# Altium footprint library Generic Footprint.PcbLib: 160 footprints (part 15 of 20) (continued)
## Symbol_FCC-Logo-3x2mm_Silkscreen [mm] (continued)
1(0.036,1.073) 1(0.036,1.076) 1(0.036,1.079) 1(0.036,1.083) 1(0.036,1.086) 1(0.036,1.09) 1(0.036,1.093) 1(0.036,1.096) 1(0.036,1.1) 1(0.036,1.103) 1(0.036,1.107) 1(0.036,1.11) 1(0.036,1.113) 1(0.036,1.117) 1(0.036,1.12) 1(0.036,1.124) 1(0.036,1.127) 1(0.036,1.13) 1(0.036,1.134) 1(0.036,1.137) 1(0.036,1.141) 1(0.036,1.144) 1(0.036,1.147) 1(0.036,1.151) 1(0.036,1.154) 1(0.036,1.158) 1(0.036,1.161) 1(0.036,1.164) 1(0.036,1.168) 1(0.036,1.171) 1(0.036,1.175) 1(0.036,1.178) 1(0.036,1.181) 1(0.036,1.185) 1(0.036,1.188) 1(0.036,1.192) 1(0.036,1.195) 1(0.036,1.198) 1(0.036,1.202) 1(0.036,1.205) 1(0.036,1.209) 1(0.036,1.212) 1(0.036,1.215) 1(0.036,1.219) 1(0.036,1.222) 1(0.036,1.226) 1(0.036,1.229) 1(0.036,1.232) 1(0.036,1.236) 1(0.036,1.239) 1(0.036,1.243) 1(0.036,1.246) 1(0.036,1.249) 1(0.036,1.253) 1(0.036,1.256) 1(0.036,1.26) 1(0.036,1.263) 1(0.036,1.266) 1(0.036,1.27) 1(0.036,1.273) 1(0.036,1.277) 1(0.036,1.28) 1(0.036,1.283) 1(0.036,1.287) 1(0.036,1.29) 1(0.036,1.294) 1(0.036,1.297) 1(0.036,1.3) 1(0.036,1.304) 1(0.036,1.307) 1(0.036,1.311) 1(0.036,1.314) 1(0.036,1.317) 1(0.036,1.321) 1(0.036,1.324) 1(0.036,1.328) 1(0.036,1.331) 1(0.036,1.334) 1(0.036,1.338) 1(0.036,1.341) 1(0.036,1.345) 1(0.036,1.348) 1(0.036,1.351) 1(0.036,1.355) 1(0.036,1.358) 1(0.036,1.362) 1(0.036,1.365) 1(0.036,1.368) 1(0.036,1.372) 1(0.036,1.375) 1(0.036,1.379) 1(0.036,1.382) 1(0.036,1.385) 1(0.036,1.389) 1(0.036,1.392) 1(0.036,1.396) 1(0.036,1.399) 1(0.036,1.402) 1(0.036,1.406) 1(0.036,1.409) 1(0.036,1.413) 1(0.036,1.416) 1(0.036,1.419) 1(0.036,1.423) 1(0.036,1.426) 1(0.036,1.43) 1(0.036,1.433) 1(0.036,1.436) 1(0.036,1.44) 1(0.036,1.443) 1(0.036,1.447) 1(0.036,1.45) 1(0.036,1.453) 1(0.036,1.457) 1(0.036,1.46) 1(0.036,1.464) 1(0.036,1.467) 1(0.036,1.47) 1(0.036,1.474) 1(0.036,1.477) 1(0.036,1.481) 1(0.036,1.484) 1(0.036,1.487) 1(0.036,1.491) 1(0.036,1.494) 1(0.036,1.498) 1(0.036,1.501) 1(0.036,1.504) 1(0.036,1.508) 1(0.036,1.511) 1(0.036,1.515) 1(0.036,1.518) 1(0.036,1.521) 1(0.036,1.525) 1(0.036,1.528) 1(0.036,1.532) 1(0.036,1.535) 1(0.036,1.538) 1(0.036,1.542) 1(0.036,1.545) 1(0.036,1.549) 1(0.036,1.552) 1(0.036,1.555) 1(0.036,1.559) 1(0.036,1.562) 1(0.036,1.566) 1(0.036,1.569) 1(0.036,1.572) 1(0.036,1.576) 1(0.036,1.579) 1(0.036,1.583) 1(0.036,1.586) 1(0.036,1.589) 1(0.036,1.593) 1(0.036,1.596) 1(0.036,1.6) 1(0.036,1.603) 1(0.036,1.606) 1(0.036,1.61) 1(0.036,1.613) 1(0.036,1.617) 1(0.036,1.62) 1(0.036,1.623) 1(0.036,1.627) 1(0.036,1.63) 1(0.036,1.634) 1(0.036,1.637) 1(0.036,1.64) 1(0.036,1.644) 1(0.036,1.647) 1(0.036,1.651) 1(0.036,1.654) 1(0.036,1.657) 1(0.036,1.661) 1(0.036,1.664) 1(0.036,1.668) 1(0.036,1.671) 1(0.036,1.674) 1(0.036,1.678) 1(0.036,1.681) 1(0.036,1.685) 1(0.036,1.688) 1(0.036,1.691) 1(0.036,1.695) 1(0.036,1.698) 1(0.036,1.702) 1(0.036,1.705) 1(0.036,1.708) 1(0.036,1.712) 1(0.036,1.715) 1(0.036,1.719) 1(0.036,1.722) 1(0.036,1.725) 1(0.036,1.729) 1(0.036,1.732) 1(0.036,1.736) 1(0.036,1.739) 1(0.036,1.742) 1(0.036,1.746) 1(0.036,1.749) 1(0.036,1.753) 1(0.036,1.756) 1(0.036,1.759) 1(0.036,1.763) 1(0.036,1.766) 1(0.036,1.77) 1(0.036,1.773) 1(0.036,1.776) 1(0.036,1.78) 1(0.036,1.783) 1(0.036,1.787) 1(0.036,1.79) 1(0.036,1.793) 1(0.036,1.797) 1(0.036,1.8) 1(0.036,1.804) 1(0.036,1.807) 1(0.036,1.81) 1(0.036,1.814) 1(0.036,1.817) 1(0.036,1.821) 1(0.036,1.824) 1(0.036,1.827) 1(0.036,1.831) 1(0.036,1.838) 1(0.036,1.841) 1(0.036,1.844) 1(0.036,1.848) 1(0.036,1.851) 1(0.036,1.855) 1(0.036,1.858) 1(0.036,1.861) 1(0.039,0.046) 1(0.039,0.049) 1(0.039,0.053) 1(0.039,0.059) 1(0.039,1.841) 1(0.039,1.844) 1(0.039,1.848) 1(0.039,1.851) 1(0.039,1.855) 1(0.039,1.858) 1(0.039,1.861) 1(0.039,1.868) 1(0.039,1.872) 1(0.039,1.875) 1(0.042,0.049) 1(0.042,0.053) 1(0.042,0.056) 1(0.042,1.855) 1(0.042,1.858) 1(0.042,1.861) 1(0.042,1.865) 1(0.042,1.868) 1(0.042,1.872) 1(0.042,1.875) 1(0.042,1.882) 1(0.042,1.892) 1(0.046,0.042) 1(0.046,0.046) 1(0.046,1.868) 1(0.046,1.872) 1(0.046,1.875) 1(0.046,1.878) 1(0.046,1.882) 1(0.046,1.889) 1(0.049,0.039) 1(0.049,0.042) 1(0.049,0.046) 1(0.049,1.892) 1(0.049,1.899) 1(0.049,1.902) 1(0.049,1.906) 1(0.053,1.882) 1(0.053,1.885) 1(0.053,1.909) 1(0.056,0.036) 1(0.056,1.892) 1(0.056,1.895) 1(0.056,1.912) 1(0.056,1.916) 1(0.056,1.919) 1(0.056,1.923) 1(0.059,0.039) 1(0.059,0.042) 1(0.059,1.916) 1(0.059,1.919) 1(0.059,1.923) 1(0.059,1.929) 1(0.063,0.032) 1(0.063,1.916) 1(0.063,1.919) 1(0.063,1.923) 1(0.063,1.929) 1(0.066,0.036) 1(0.066,0.039) 1(0.07,1.926) 1(0.07,1.929) 1(0.07,1.943) 1(0.073,0.029) 1(0.073,1.933) 1(0.073,1.936) 1(0.073,1.94) 1(0.073,1.943) 1(0.073,1.95) 1(0.073,1.953) 1(0.073,1.957) 1(0.073,1.96) 1(0.076,0.025) 1(0.076,0.032) 1(0.076,0.036) 1(0.076,1.943) 1(0.076,1.946) 1(0.076,1.95) 1(0.076,1.953) 1(0.076,1.963) 1(0.08,1.95) 1(0.08,1.953) 1(0.08,1.96) 1(0.08,1.963) 1(0.08,1.967) 1(0.083,1.96) 1(0.083,1.963) 1(0.083,1.97) 1(0.087,1.974) 1(0.087,1.977) 1(0.09,1.977) 1(0.09,1.98) 1(0.093,1.977) 1(0.093,1.98) 1(0.093,1.987) 1(0.093,1.991) 1(0.097,1.98) 1(0.097,1.987) 1(0.097,1.991) 1(0.097,1.997) 1(0.1,1.984) 1(0.1,1.994) 1(0.1,2.001) 1(0.104,1.987) 1(0.104,1.991) 1(0.104,1.994) 1(0.104,1.997) 1(0.107,1.994) 1(0.107,1.997) 1(0.107,2.004) 1(0.107,2.008) 1(0.107,2.011) 1(0.11,2.014) 1(0.114,2.018) 1(0.121,2.025) 1(0.121,2.028) 1(0.124,2.025) 1(0.124,2.028) 1(0.124,2.031) 1(0.127,2.021) 1(0.127,2.025) 1(0.127,2.031) 1(0.127,2.035) 1(0.131,2.028) 1(0.131,2.035) 1(0.131,2.038) 1(0.134,2.031) 1(0.134,2.035) 1(0.134,2.042) 1(0.138,2.038) 1(0.138,2.045) 1(0.141,2.038) 1(0.141,2.048) 1(0.144,2.052) 1(0.148,2.048) 1(0.148,2.055) 1(0.151,2.048) 1(0.151,2.052) 1(0.151,2.059) 1(0.155,2.052) 1(0.155,2.055) 1(0.155,2.062) 1(0.158,2.055) 1(0.158,2.059) 1(0.158,2.062) 1(0.158,2.065) 1(0.161,2.059) 1(0.161,2.065) 1(0.161,2.069) 1(0.165,2.062) 1(0.165,2.072) 1(0.168,2.065) 1(0.172,2.076) 1(0.175,2.079) 1(0.178,2.082) 1(0.182,2.079) 1(0.185,2.086) 1(0.189,2.079) 1(0.189,2.089) 1(0.192,2.093) 1(0.195,2.089) 1(0.195,2.093) 1(0.195,2.096) 1(0.202,2.089) 1(0.202,2.096) 1(0.202,2.099) 1(0.206,2.093) 1(0.212,2.096) 1(0.212,2.103) 1(0.216,2.106) 1(0.219,2.11) 1(0.229,2.106) 1(0.229,2.11) 1(0.229,2.113) 1(0.236,2.106) 1(0.236,2.11) 1(0.24,2.113) 1(0.24,2.116) 1(0.246,2.113) 1(0.246,2.116) 1(0.246,2.12) 1(0.26,2.116) 1(0.26,2.12) 1(0.26,2.123) 1(0.27,2.127) 1(0.274,2.12) 1(0.274,2.13) 1(0.277,2.123) 1(0.294,2.123) 1(0.297,2.133) 1(0.365,0.029) 1(0.365,0.042) 1(0.365,0.046) 1(0.365,0.049) 1(0.365,0.053) 1(0.365,0.056) 1(0.365,0.059) 1(0.365,0.063) 1(0.365,0.066) 1(0.365,0.07) 1(0.365,0.073) 1(0.365,0.076) 1(0.365,0.08) 1(0.365,0.083) 1(0.365,0.087) 1(0.365,0.09) 1(0.365,0.093) 1(0.365,0.097) 1(0.365,0.1) 1(0.365,0.104) 1(0.365,0.107) 1(0.365,0.11) 1(0.365,0.114) 1(0.365,0.117) 1(0.365,0.121) 1(0.365,0.124) 1(0.365,0.127) 1(0.365,0.131) 1(0.365,0.134) 1(0.365,0.138) 1(0.365,0.141) 1(0.365,0.144) 1(0.365,0.148) 1(0.365,0.151) 1(0.365,0.155) 1(0.365,0.158) 1(0.365,0.161) 1(0.365,0.165) 1(0.365,0.168) 1(0.365,0.172) 1(0.365,0.175) 1(0.365,0.178) 1(0.365,0.182) 1(0.365,0.185) 1(0.365,0.189) 1(0.365,0.192) 1(0.365,0.195) 1(0.365,0.199) 1(0.365,0.202) 1(0.365,0.206) 1(0.365,0.209) 1(0.365,0.212) 1(0.365,0.216) 1(0.365,0.219) 1(0.365,0.223) 1(0.365,0.226) 1(0.365,0.229) 1(0.365,0.233) 1(0.365,0.236) 1(0.365,0.24) 1(0.365,0.243) 1(0.365,0.246) 1(0.365,0.25) 1(0.365,0.253) 1(0.365,0.257) 1(0.365,0.26) 1(0.365,0.263) 1(0.365,0.267) 1(0.365,0.27) 1(0.365,0.274) 1(0.365,0.277) 1(0.365,0.28) 1(0.365,0.284) 1(0.365,0.287) 1(0.365,0.291) 1(0.365,0.294) 1(0.365,0.297) 1(0.365,0.301) 1(0.365,0.304) 1(0.365,0.308) 1(0.365,0.311) 1(0.365,0.314) 1(0.365,0.318) 1(0.365,0.321) 1(0.365,0.325) 1(0.365,0.328) 1(0.365,0.331) 1(0.365,0.335) 1(0.365,0.338) 1(0.365,0.342) 1(0.365,0.345) 1(0.365,0.348) 1(0.365,0.352) 1(0.365,0.355) 1(0.365,0.359) 1(0.365,0.362) 1(0.365,0.365) 1(0.365,0.369) 1(0.365,0.372) 1(0.365,0.376) 1(0.365,0.379) 1(0.365,0.382) 1(0.365,0.386) 1(0.365,0.389) 1(0.365,0.393) 1(0.365,0.396) 1(0.365,0.399) 1(0.365,0.403) 1(0.365,0.406) 1(0.365,0.41) 1(0.365,0.413) 1(0.365,0.416) 1(0.365,0.42) 1(0.365,0.423) 1(0.365,0.427) 1(0.365,0.43) 1(0.365,0.433) 1(0.365,0.437) 1(0.365,0.44) 1(0.365,0.444) 1(0.365,0.447) 1(0.365,0.45) 1(0.365,0.454) 1(0.365,0.457) 1(0.365,0.461) 1(0.365,0.464) 1(0.365,0.467) 1(0.365,0.471) 1(0.365,0.474) 1(0.365,0.478) 1(0.365,0.481) 1(0.365,0.484) 1(0.365,0.488) 1(0.365,0.491) 1(0.365,0.495) 1(0.365,0.498) 1(0.365,0.501) 1(0.365,0.505) 1(0.365,0.508) 1(0.365,0.512) 1(0.365,0.515) 1(0.365,0.518) 1(0.365,0.522) 1(0.365,0.525) 1(0.365,0.529) 1(0.365,0.532) 1(0.365,0.535) 1(0.365,0.539) 1(0.365,0.542) 1(0.365,0.546) 1(0.365,0.549) 1(0.365,0.552) 1(0.365,0.556) 1(0.365,0.559) 1(0.365,0.563) 1(0.365,0.566) 1(0.365,0.569) 1(0.365,0.573) 1(0.365,0.576) 1(0.365,0.58) 1(0.365,0.583) 1(0.365,0.586) 1(0.365,0.59) 1(0.365,0.593) 1(0.365,0.597) 1(0.365,0.6) 1(0.365,0.603) 1(0.365,0.607) 1(0.365,0.61) 1(0.365,0.614) 1(0.365,0.617) 1(0.365,0.62) 1(0.365,0.624) 1(0.365,0.627) 1(0.365,0.631) 1(0.365,0.634) 1(0.365,0.637) 1(0.365,0.641) 1(0.365,0.644) 1(0.365,0.648) 1(0.365,0.651) 1(0.365,0.654) 1(0.365,0.658) 1(0.365,0.661) 1(0.365,0.665) 1(0.365,0.668) 1(0.365,0.671) 1(0.365,0.675) 1(0.365,0.678) 1(0.365,0.682) 1(0.365,0.685) 1(0.365,0.688) 1(0.365,0.692) 1(0.365,0.695) 1(0.365,0.699) 1(0.365,0.702) 1(0.365,0.705) 1(0.365,0.709) 1(0.365,0.712) 1(0.365,0.716) 1(0.365,0.719) 1(0.365,0.722) 1(0.365,0.726) 1(0.365,0.729) 1(0.365,0.733) 1(0.365,0.736) 1(0.365,0.739) 1(0.365,0.743) 1(0.365,0.746) 1(0.365,0.75) 1(0.365,0.753) 1(0.365,0.756) 1(0.365,0.76) 1(0.365,0.763) 1(0.365,0.767) 1(0.365,0.77) 1(0.365,0.773) 1(0.365,0.777) 1(0.365,0.78) 1(0.365,0.784) 1(0.365,0.787) 1(0.365,0.79) 1(0.365,0.794) 1(0.365,0.797) 1(0.365,0.801) 1(0.365,0.804) 1(0.365,0.807) 1(0.365,0.811) 1(0.365,0.814) 1(0.365,0.818) 1(0.365,0.821) 1(0.365,0.824) 1(0.365,0.828) 1(0.365,0.831) 1(0.365,0.835) 1(0.365,0.838) 1(0.365,0.841) 1(0.365,0.845) 1(0.365,0.848) 1(0.365,0.852) 1(0.365,0.855) 1(0.365,0.858) 1(0.365,0.862) 1(0.365,0.865) 1(0.365,0.869) 1(0.365,0.872) 1(0.365,0.875) 1(0.365,0.879) 1(0.365,0.882) 1(0.365,0.886) 1(0.365,0.889) 1(0.365,0.892) 1(0.365,0.896) 1(0.365,0.903) 1(0.365,1.722) 1(0.365,1.725) 1(0.369,0.025) 1(0.369,0.042) 1(0.369,0.046) 1(0.369,0.049) 1(0.369,0.053) 1(0.369,0.056) 1(0.369,0.059) 1(0.369,0.063) 1(0.369,0.066) 1(0.369,0.07) 1(0.369,0.073) 1(0.369,0.076) 1(0.369,0.08) 1(0.369,0.083) 1(0.369,0.087) 1(0.369,0.09) 1(0.369,0.093) 1(0.369,0.097) 1(0.369,0.1) 1(0.369,0.104) 1(0.369,0.107) 1(0.369,0.11) 1(0.369,0.114) 1(0.369,0.117) 1(0.369,0.121) 1(0.369,0.124) 1(0.369,0.127) 1(0.369,0.131) 1(0.369,0.134) 1(0.369,0.138) 1(0.369,0.141) 1(0.369,0.144) 1(0.369,0.148) 1(0.369,0.151) 1(0.369,0.155) 1(0.369,0.158) 1(0.369,0.161) 1(0.369,0.165) 1(0.369,0.168) 1(0.369,0.172) 1(0.369,0.175) 1(0.369,0.178) 1(0.369,0.182) 1(0.369,0.185) 1(0.369,0.189) 1(0.369,0.192) 1(0.369,0.195) 1(0.369,0.199) 1(0.369,0.202) 1(0.369,0.206) 1(0.369,0.209) 1(0.369,0.212) 1(0.369,0.216) 1(0.369,0.219) 1(0.369,0.223) 1(0.369,0.226) 1(0.369,0.229) 1(0.369,0.233) 1(0.369,0.236) 1(0.369,0.24) 1(0.369,0.243) 1(0.369,0.246) 1(0.369,0.25) 1(0.369,0.253) 1(0.369,0.257) 1(0.369,0.26) 1(0.369,0.263) 1(0.369,0.267) 1(0.369,0.27) 1(0.369,0.274) 1(0.369,0.277) 1(0.369,0.28) 1(0.369,0.284) 1(0.369,0.287) 1(0.369,0.291) 1(0.369,0.294) 1(0.369,0.297) 1(0.369,0.301) 1(0.369,0.304) 1(0.369,0.308) 1(0.369,0.311) 1(0.369,0.314) 1(0.369,0.318) 1(0.369,0.321) 1(0.369,0.325) 1(0.369,0.328) 1(0.369,0.331) 1(0.369,0.335) 1(0.369,0.338) 1(0.369,0.342) 1(0.369,0.345) 1(0.369,0.348) 1(0.369,0.352) 1(0.369,0.355) 1(0.369,0.359) 1(0.369,0.362) 1(0.369,0.365) 1(0.369,0.369) 1(0.369,0.372) 1(0.369,0.376) 1(0.369,0.379) 1(0.369,0.382) 1(0.369,0.386) 1(0.369,0.389) 1(0.369,0.393) 1(0.369,0.396) 1(0.369,0.399) 1(0.369,0.403) 1(0.369,0.406) 1(0.369,0.41) 1(0.369,0.413) 1(0.369,0.416) 1(0.369,0.42) 1(0.369,0.423) 1(0.369,0.427) 1(0.369,0.43) 1(0.369,0.433) 1(0.369,0.437) 1(0.369,0.44) 1(0.369,0.444) 1(0.369,0.447) 1(0.369,0.45) 1(0.369,0.454) 1(0.369,0.457) 1(0.369,0.461) 1(0.369,0.464) 1(0.369,0.467) 1(0.369,0.471) 1(0.369,0.474) 1(0.369,0.478) 1(0.369,0.481) 1(0.369,0.484) 1(0.369,0.488) 1(0.369,0.491) 1(0.369,0.495) 1(0.369,0.498) 1(0.369,0.501) 1(0.369,0.505) 1(0.369,0.508) 1(0.369,0.512) 1(0.369,0.515) 1(0.369,0.518) 1(0.369,0.522) 1(0.369,0.525) 1(0.369,0.529) 1(0.369,0.532) 1(0.369,0.535) 1(0.369,0.539) 1(0.369,0.542) 1(0.369,0.546) 1(0.369,0.549) 1(0.369,0.552) 1(0.369,0.556) 1(0.369,0.559) 1(0.369,0.563) 1(0.369,0.566) 1(0.369,0.569) 1(0.369,0.573) 1(0.369,0.576) 1(0.369,0.58) 1(0.369,0.583) 1(0.369,0.586) 1(0.369,0.59) 1(0.369,0.593) 1(0.369,0.597) 1(0.369,0.6) 1(0.369,0.603) 1(0.369,0.607) 1(0.369,0.61) 1(0.369,0.614) 1(0.369,0.617) 1(0.369,0.62) 1(0.369,0.624) 1(0.369,0.627) 1(0.369,0.631) 1(0.369,0.634) 1(0.369,0.637) 1(0.369,0.641) 1(0.369,0.644) 1(0.369,0.648) 1(0.369,0.651) 1(0.369,0.654) 1(0.369,0.658) 1(0.369,0.661) 1(0.369,0.665) 1(0.369,0.668) 1(0.369,0.671) 1(0.369,0.675) 1(0.369,0.678) 1(0.369,0.682) 1(0.369,0.685) 1(0.369,0.688) 1(0.369,0.692) 1(0.369,0.695) 1(0.369,0.699) 1(0.369,0.702) 1(0.369,0.705) 1(0.369,0.709) 1(0.369,0.712) 1(0.369,0.716) 1(0.369,0.719) 1(0.369,0.722) 1(0.369,0.726) 1(0.369,0.729) 1(0.369,0.733) 1(0.369,0.736) 1(0.369,0.739) 1(0.369,0.743) 1(0.369,0.746) 1(0.369,0.75) 1(0.369,0.753) 1(0.369,0.756) 1(0.369,0.76) 1(0.369,0.763) 1(0.369,0.767) 1(0.369,0.77) 1(0.369,0.773) 1(0.369,0.777) 1(0.369,0.78) 1(0.369,0.784) 1(0.369,0.787) 1(0.369,0.79) 1(0.369,0.794) 1(0.369,0.797) 1(0.369,0.801) 1(0.369,0.804) 1(0.369,0.807) 1(0.369,0.811) 1(0.369,0.814) 1(0.369,0.818) 1(0.369,0.821) 1(0.369,0.824) 1(0.369,0.828) 1(0.369,0.831) 1(0.369,0.835) 1(0.369,0.838) 1(0.369,0.841) 1(0.369,0.845) 1(0.369,0.848) 1(0.369,0.852) 1(0.369,0.855) 1(0.369,0.858) 1(0.369,0.862) 1(0.369,0.865) 1(0.369,0.869) 1(0.369,0.872) 1(0.369,0.875) 1(0.369,0.879) 1(0.369,0.882) 1(0.369,0.886) 1(0.369,0.889) 1(0.369,0.892) 1(0.369,0.896) 1(0.369,0.903) 1(0.369,0.913) 1(0.369,1.722) 1(0.369,1.725) 1(0.369,1.729) 1(0.369,1.732) 1(0.372,0.032) 1(0.372,0.036) 1(0.372,0.909) 1(0.372,1.188) 1(0.372,1.192) 1(0.372,1.195) 1(0.372,1.198) 1(0.372,1.202) 1(0.372,1.205) 1(0.372,1.209) 1(0.372,1.212) 1(0.372,1.215) 1(0.372,1.219) 1(0.372,1.222) 1(0.372,1.226) 1(0.372,1.229) 1(0.372,1.232) 1(0.372,1.236) 1(0.372,1.239) 1(0.372,1.243) 1(0.372,1.246) 1(0.372,1.249) 1(0.372,1.253) 1(0.372,1.256) 1(0.372,1.26) 1(0.372,1.263) 1(0.372,1.266) 1(0.372,1.27) 1(0.372,1.273) 1(0.372,1.277) 1(0.372,1.28) 1(0.372,1.283) 1(0.372,1.287) 1(0.372,1.29) 1(0.372,1.294) 1(0.372,1.297) 1(0.372,1.3) 1(0.372,1.304) 1(0.372,1.307) 1(0.372,1.311) 1(0.372,1.314) 1(0.372,1.317) 1(0.372,1.321) 1(0.372,1.324) 1(0.372,1.328) 1(0.372,1.331) 1(0.372,1.334) 1(0.372,1.338) 1(0.372,1.341) 1(0.372,1.345) 1(0.372,1.348) 1(0.372,1.351) 1(0.372,1.355) 1(0.372,1.358) 1(0.372,1.362) 1(0.372,1.365) 1(0.372,1.368) 1(0.372,1.372) 1(0.372,1.375) 1(0.372,1.379) 1(0.372,1.382) 1(0.372,1.385) 1(0.372,1.389) 1(0.372,1.392) 1(0.372,1.396) 1(0.372,1.399) 1(0.372,1.402) 1(0.372,1.406) 1(0.372,1.409) 1(0.372,1.413) 1(0.372,1.416) 1(0.372,1.419) 1(0.372,1.423) 1(0.372,1.426) 1(0.372,1.43) 1(0.372,1.433) 1(0.372,1.436) 1(0.372,1.44) 1(0.372,1.443) 1(0.372,1.447) 1(0.372,1.45) 1(0.372,1.453) 1(0.372,1.457) 1(0.372,1.46) 1(0.372,1.464) 1(0.372,1.467) 1(0.372,1.47) 1(0.372,1.474) 1(0.372,1.477) 1(0.372,1.481) 1(0.372,1.484) 1(0.372,1.487) 1(0.372,1.491) 1(0.372,1.494) 1(0.372,1.498) 1(0.372,1.501) 1(0.372,1.504) 1(0.372,1.508) 1(0.372,1.511) 1(0.372,1.515) 1(0.372,1.518) 1(0.372,1.521) 1(0.372,1.525) 1(0.372,1.528) 1(0.372,1.532) 1(0.372,1.535) 1(0.372,1.538) 1(0.372,1.542) 1(0.372,1.545) 1(0.372,1.549) 1(0.372,1.552) 1(0.372,1.555) 1(0.372,1.559) 1(0.372,1.562) 1(0.372,1.566) 1(0.372,1.569) 1(0.372,1.572) 1(0.372,1.576) 1(0.372,1.579) 1(0.372,1.583) 1(0.372,1.586) 1(0.372,1.589) 1(0.372,1.593) 1(0.372,1.596) 1(0.372,1.6) 1(0.372,1.603) 1(0.372,1.606) 1(0.372,1.61) 1(0.372,1.613) 1(0.372,1.617) 1(0.372,1.62) 1(0.372,1.623) 1(0.372,1.627) 1(0.372,1.63) 1(0.372,1.634) 1(0.372,1.637) 1(0.372,1.64) 1(0.372,1.644) 1(0.372,1.647) 1(0.372,1.651) 1(0.372,1.654) 1(0.372,1.657) 1(0.372,1.661) 1(0.372,1.664) 1(0.372,1.668) 1(0.372,1.671) 1(0.372,1.674) 1(0.372,1.678) 1(0.372,1.681) 1(0.372,1.685) 1(0.372,1.688) 1(0.372,1.691) 1(0.372,1.695) 1(0.372,1.698) 1(0.372,1.702) 1(0.372,1.705) 1(0.372,1.708) 1(0.372,1.712) 1(0.372,1.715) 1(0.372,1.719) 1(0.372,1.725) 1(0.376,0.032) 1(0.376,0.039) 1(0.376,0.042) 1(0.376,0.046) 1(0.376,0.049) 1(0.376,0.053) 1(0.376,0.056) 1(0.376,0.059) 1(0.376,0.063) 1(0.376,0.066) 1(0.376,0.07) 1(0.376,0.073) 1(0.376,0.076) 1(0.376,0.08) 1(0.376,0.083) 1(0.376,0.087) 1(0.376,0.09) 1(0.376,0.093) 1(0.376,0.097) 1(0.376,0.1) 1(0.376,0.104) 1(0.376,0.107) 1(0.376,0.11) 1(0.376,0.114) 1(0.376,0.117) 1(0.376,0.121) 1(0.376,0.124) 1(0.376,0.127) 1(0.376,0.131) 1(0.376,0.134) 1(0.376,0.138) 1(0.376,0.141) 1(0.376,0.144) 1(0.376,0.148) 1(0.376,0.151) 1(0.376,0.155) 1(0.376,0.158) 1(0.376,0.161) 1(0.376,0.165) 1(0.376,0.168) 1(0.376,0.172) 1(0.376,0.175) 1(0.376,0.178) 1(0.376,0.182) 1(0.376,0.185) 1(0.376,0.189) 1(0.376,0.192) 1(0.376,0.195) 1(0.376,0.199) 1(0.376,0.202) 1(0.376,0.206) 1(0.376,0.209) 1(0.376,0.212) 1(0.376,0.216) 1(0.376,0.219) 1(0.376,0.223) 1(0.376,0.226) 1(0.376,0.229) 1(0.376,0.233) 1(0.376,0.236) 1(0.376,0.24) 1(0.376,0.243) 1(0.376,0.246) 1(0.376,0.25) 1(0.376,0.253) 1(0.376,0.257) 1(0.376,0.26) 1(0.376,0.263) 1(0.376,0.267) 1(0.376,0.27) 1(0.376,0.274) 1(0.376,0.277) 1(0.376,0.28) 1(0.376,0.284) 1(0.376,0.287) 1(0.376,0.291) 1(0.376,0.294) 1(0.376,0.297) 1(0.376,0.301) 1(0.376,0.304) 1(0.376,0.308) 1(0.376,0.311) 1(0.376,0.314) 1(0.376,0.318) 1(0.376,0.321) 1(0.376,0.325) 1(0.376,0.328) 1(0.376,0.331) 1(0.376,0.335) 1(0.376,0.338) 1(0.376,0.342) 1(0.376,0.345) 1(0.376,0.348) 1(0.376,0.352) 1(0.376,0.355) 1(0.376,0.359) 1(0.376,0.362) 1(0.376,0.365) 1(0.376,0.369) 1(0.376,0.372) 1(0.376,0.376) 1(0.376,0.379) 1(0.376,0.382) 1(0.376,0.386) 1(0.376,0.389) 1(0.376,0.393) 1(0.376,0.396) 1(0.376,0.399) 1(0.376,0.403) 1(0.376,0.406) 1(0.376,0.41) 1(0.376,0.413) 1(0.376,0.416) 1(0.376,0.42) 1(0.376,0.423) 1(0.376,0.427) 1(0.376,0.43) 1(0.376,0.433) 1(0.376,0.437) 1(0.376,0.44) 1(0.376,0.444) 1(0.376,0.447) 1(0.376,0.45) 1(0.376,0.454) 1(0.376,0.457) 1(0.376,0.461) 1(0.376,0.464) 1(0.376,0.467) 1(0.376,0.471) 1(0.376,0.474) 1(0.376,0.478) 1(0.376,0.481) 1(0.376,0.484) 1(0.376,0.488) 1(0.376,0.491) 1(0.376,0.495) 1(0.376,0.498) 1(0.376,0.501) 1(0.376,0.505) 1(0.376,0.508) 1(0.376,0.512) 1(0.376,0.515) 1(0.376,0.518) 1(0.376,0.522) 1(0.376,0.525) 1(0.376,0.529) 1(0.376,0.532) 1(0.376,0.535) 1(0.376,0.539) 1(0.376,0.542) 1(0.376,0.546) 1(0.376,0.549) 1(0.376,0.552) 1(0.376,0.556) 1(0.376,0.559) 1(0.376,0.563) 1(0.376,0.566) 1(0.376,0.569) 1(0.376,0.573) 1(0.376,0.576) 1(0.376,0.58) 1(0.376,0.583) 1(0.376,0.586) 1(0.376,0.59) 1(0.376,0.593) 1(0.376,0.597) 1(0.376,0.6) 1(0.376,0.603) 1(0.376,0.607) 1(0.376,0.61) 1(0.376,0.614) 1(0.376,0.617) 1(0.376,0.62) 1(0.376,0.624) 1(0.376,0.627) 1(0.376,0.631) 1(0.376,0.634) 1(0.376,0.637) 1(0.376,0.641) 1(0.376,0.644) 1(0.376,0.648) 1(0.376,0.651) 1(0.376,0.654) 1(0.376,0.658) 1(0.376,0.661) 1(0.376,0.665) 1(0.376,0.668) 1(0.376,0.671) 1(0.376,0.675) 1(0.376,0.678) 1(0.376,0.682) 1(0.376,0.685) 1(0.376,0.688) 1(0.376,0.692) 1(0.376,0.695) 1(0.376,0.699) 1(0.376,0.702) 1(0.376,0.705) 1(0.376,0.709) 1(0.376,0.712) 1(0.376,0.716) 1(0.376,0.719) 1(0.376,0.722) 1(0.376,0.726) 1(0.376,0.729) 1(0.376,0.733) 1(0.376,0.736) 1(0.376,0.739) 1(0.376,0.743) 1(0.376,0.746) 1(0.376,0.75) 1(0.376,0.753) 1(0.376,0.756) 1(0.376,0.76) 1(0.376,0.763) 1(0.376,0.767) 1(0.376,0.77) 1(0.376,0.773) 1(0.376,0.777) 1(0.376,0.78) 1(0.376,0.784) 1(0.376,0.787) 1(0.376,0.79) 1(0.376,0.794) 1(0.376,0.797) 1(0.376,0.801) 1(0.376,0.804) 1(0.376,0.807) 1(0.376,0.811) 1(0.376,0.814) 1(0.376,0.818) 1(0.376,0.821) 1(0.376,0.824) 1(0.376,0.828) 1(0.376,0.831) 1(0.376,0.835) 1(0.376,0.838) 1(0.376,0.841) 1(0.376,0.845) 1(0.376,0.848) 1(0.376,0.852) 1(0.376,0.855) 1(0.376,0.858) 